# Altium schematic symbol library AliPadash.SchLib: 1186 symbols (part 3 of 6) (continued)
## Heat-sink (continued)
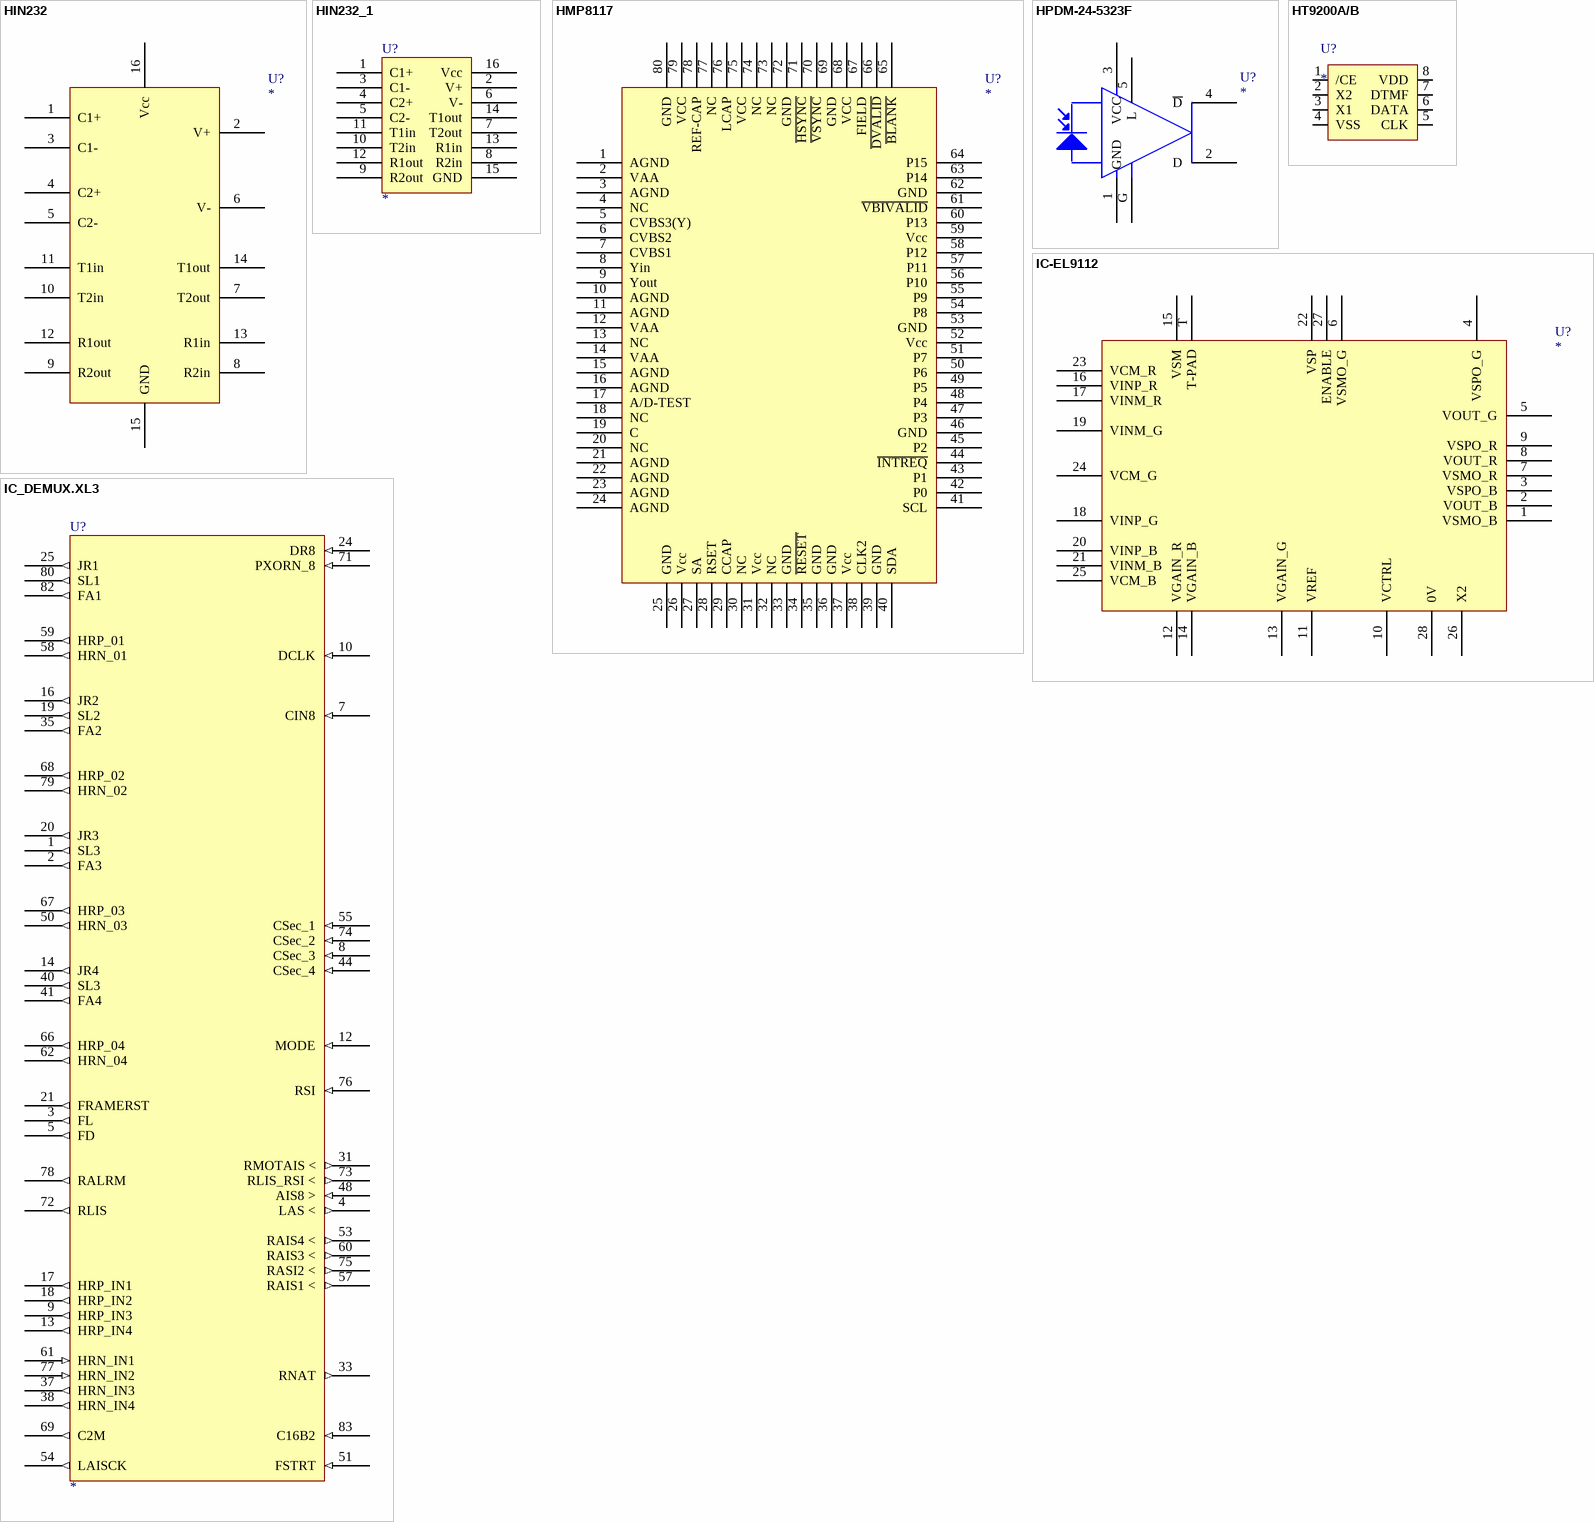
[diagram p31: symbols HIN232 to IC_DEMUX.XL3]

## HIN232
designator U?
footprint DIP16
pins: 1 C1+, 2 V+, 3 C1-, 4 C2+, 5 C2-, 6 V-, 7 T2out, 8 R2in, 9 R2out, 10 T2in, 11 T1in, 12 R1out, 13 R1in, 14 T1out, 15 GND, 16 Vcc

## HIN232_1
designator U?
footprint DIP16
pins: 1 C1+, 2 V+, 3 C1-, 4 C2+, 5 C2-, 6 V-, 7 T2out, 8 R2in, 9 R2out, 10 T2in, 11 T1in, 12 R1out, 13 R1in, 14 T1out, 15 GND, 16 Vcc

## HMP8117
designator U?
footprint MQFP80
pins: 1 AGND, 2 VAA, 3 AGND, 4 NC, 5 CVBS3(Y), 6 CVBS2, 7 CVBS1, 8 Yin, 9 Yout, 10 AGND, 11 AGND, 12 VAA, 13 NC, 14 VAA, 15 AGND, 16 AGND, 17 A/D-TEST, 18 NC, 19 C, 20 NC, 21 AGND, 22 AGND, 23 AGND, 24 AGND, 25 GND, 26 Vcc, 27 SA, 28 RSET, 29 CCAP, 30 NC, 31 Vcc, 32 NC, 33 GND, 34 ~{RESET}, 35 GND, 36 GND, 37 Vcc, 38 CLK2, 39 GND, 40 SDA, 41 SCL, 42 P0, 43 P1, 44 ~{INTREQ}, 45 P2, 46 GND, 47 P3, 48 P4, 49 P5, 50 P6, 51 P7, 52 Vcc, 53 GND, 54 P8, 55 P9, 56 P10, 57 P11, 58 P12, 59 Vcc, 60 P13, 61 ~{VBIVALID}, 62 GND, 63 P14, 64 P15, 65 ~{BLANK}, 66 ~{DVALID}, 67 FIELD, 68 VCC, 69 GND, 70 ~{VSYNC}, 71 ~{HSYNC}, 72 GND, 73 NC, 74 NC, 75 VCC, 76 LCAP, 77 NC, 78 REF-CAP, 79 VCC, 80 GND

## HPDM-24-5323F
designator U?
footprint LDHP3
pins: 1 GND, 2 D, 3 VCC, 4 ~{D}, 5 L, G

## HT9200A/B
designator U?
footprint DIP8-SMD
pins: 1 /CE, 2 X2, 3 X1, 4 VSS, 5 CLK, 6 DATA, 7 DTMF, 8 VDD

## IC-EL9112
designator U?
footprint QFN28
pins: 1 VSMO_B, 2 VOUT_B, 3 VSPO_B, 4 VSPO_G, 5 VOUT_G, 6 VSMO_G, 7 VSMO_R, 8 VOUT_R, 9 VSPO_R, 10 VCTRL, 11 VREF, 12 VGAIN_R, 13 VGAIN_G, 14 VGAIN_B, 15 VSM, 16 VINP_R, 17 VINM_R, 18 VINP_G, 19 VINM_G, 20 VINP_B, 21 VINM_B, 22 VSP, 23 VCM_R, 24 VCM_G, 25 VCM_B, 26 X2, 27 ENABLE, 28 0V, T T-PAD

## IC_DEMUX.XL3
designator U?
pins: 1 SL3 (out), 2 FA3 (out), 3 FL (out), 4 LAS < (out), 5 FD (out), 6 GND (power) hidden to GND, 7 CIN8 (in), 8 CSec_3 (in), 9 HRP_IN3 (out), 10 DCLK (in), 12 MODE (in), 13 HRP_IN4 (out), 14 JR4 (out), 16 JR2 (out), 17 HRP_IN1 (out), 18 HRP_IN2 (out), 19 SL2 (out), 20 JR3 (out), 21 FRAMERST (out), 22 VCC (power) hidden to VCC, 24 DR8 (in), 25 JR1 (out), 28 GND (power) hidden to GND, 31 RMOTAIS < (out), 33 RNAT (out), 35 FA2 (out), 37 HRN_IN3 (out), 38 HRN_IN4 (out), 40 SL3 (out), 41 FA4 (out), 43 VCC (power) hidden to VCC, 44 CSec_4 (in), 48 AIS8 > (in), 49 GND (power) hidden to GND, 50 HRN_03 (out), 51 FSTRT (in), 53 RAIS4 < (out), 54 LAISCK (out), 55 CSec_1 (in), 57 RAIS1 < (out), 58 HRN_01 (out), 59 HRP_01 (out), 60 RAIS3 < (out), 61 HRN_IN1 (in), 62 HRN_04 (out), 65 VCC (power) hidden to VCC, 66 HRP_04 (out), 67 HRP_03 (out), 68 HRP_02 (out), 69 C2M (out), 70 GND (power) hidden to GND, 71 PXORN_8 (in), 72 RLIS (out), 73 RLIS_RSI < (out), 74 CSec_2 (in), 75 RASI2 < (out), 76 RSI (in), 77 HRN_IN2 (in), 78 RALRM (out), 79 HRN_02 (out), 80 SL1 (out), 82 FA1 (out), 83 C16B2 (in), 84 VCC (power) hidden to VCC

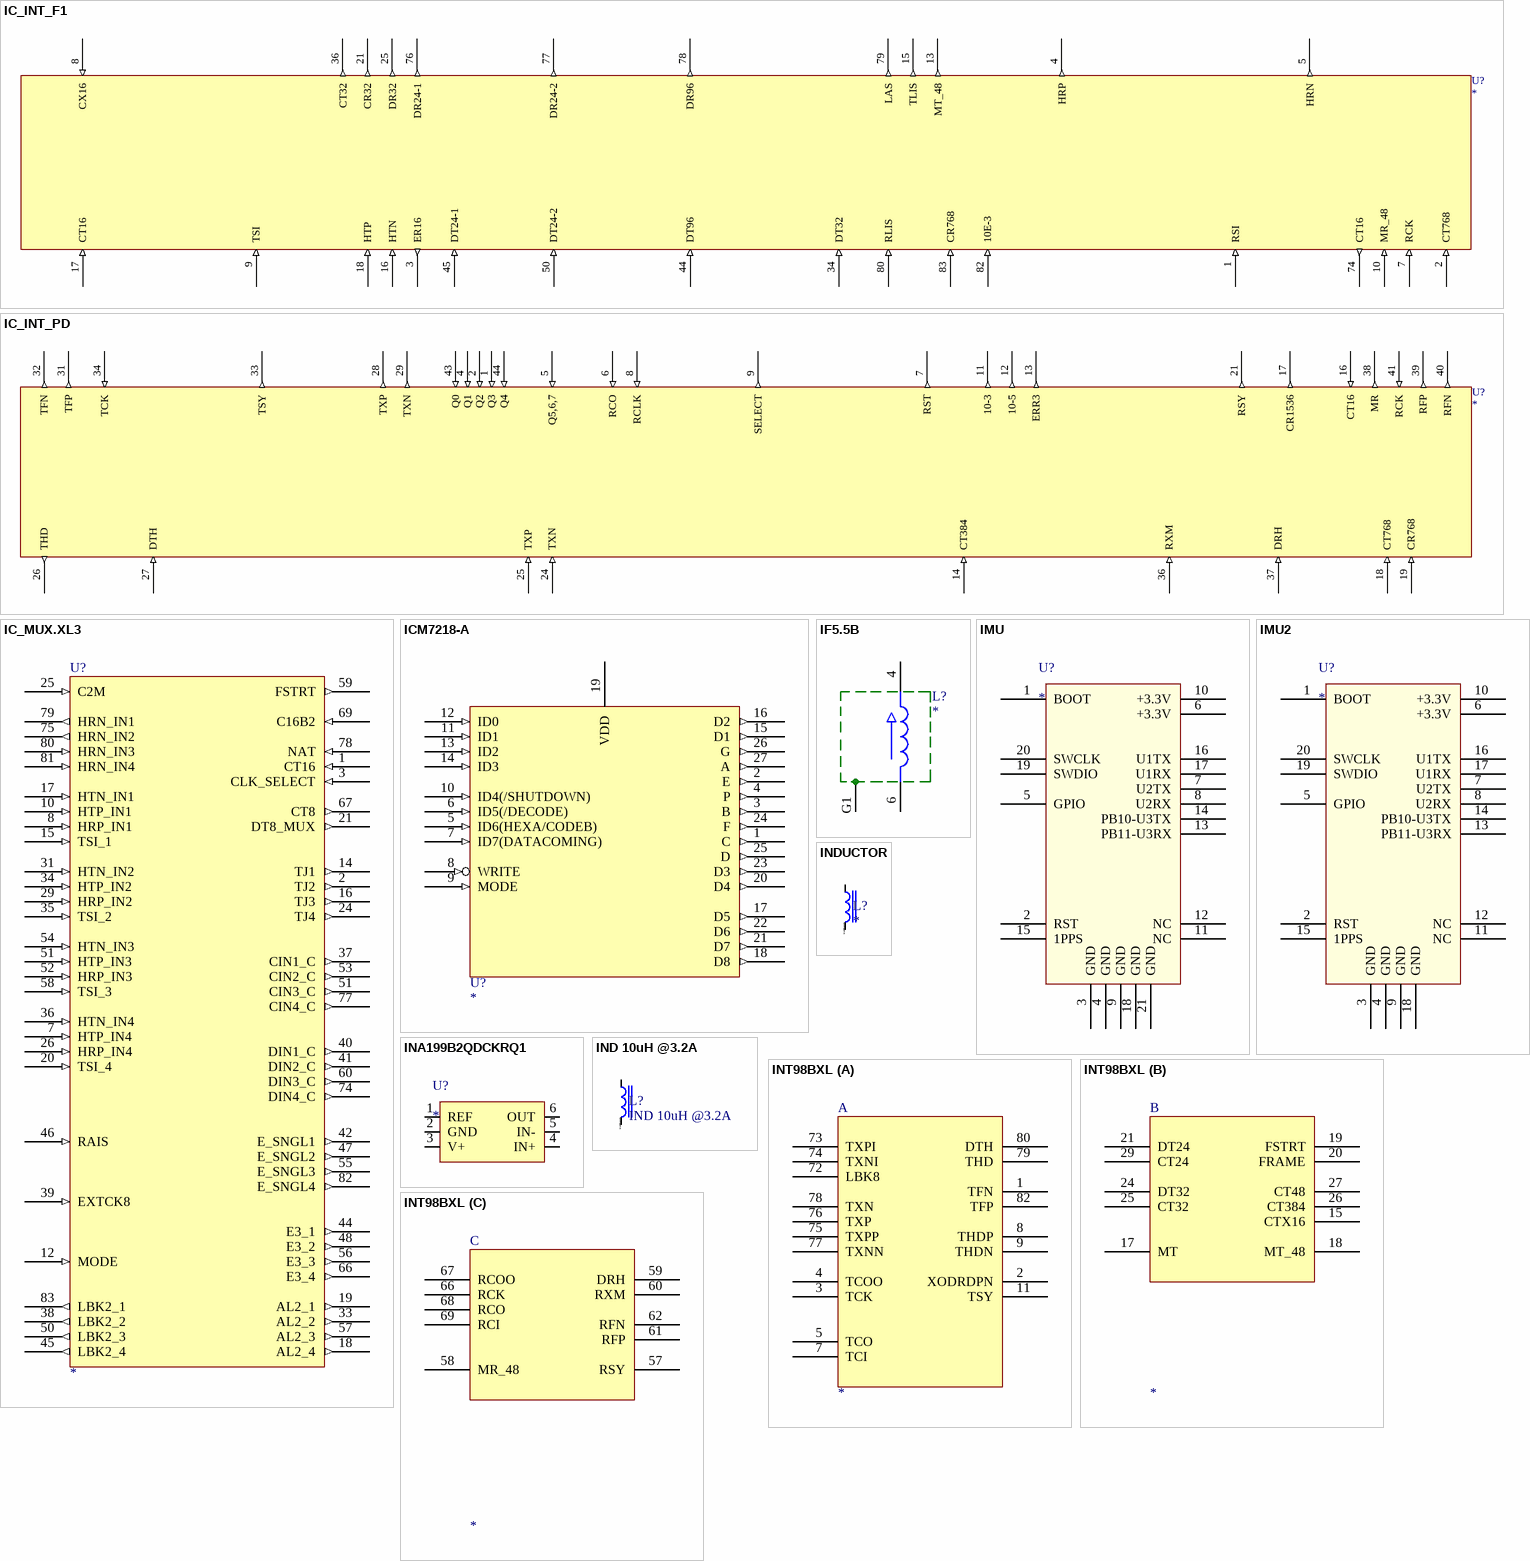
[diagram p32: symbols IC_INT_F1 to INT98BXL]

## IC_INT_F1
designator U?
pins: 1 RSI (in), 2 CT768 (in), 3 ER16 (out), 4 HRP (out), 5 HRN (out), 7 RCK (in), 8 CX16 (in), 9 TSI (in), 10 MR_48 (in), 13 MT_48 (out), 15 TLIS (out), 16 HTN (in), 17 CT16 (in), 18 HTP (in), 21 CR32 (out), 25 DR32 (out), 34 DT32 (in), 36 CT32 (out), 44 DT96 (in), 45 DT24-1 (in), 50 DT24-2 (in), 74 CT16 (out), 76 DR24-1 (out), 77 DR24-2 (out), 78 DR96 (out), 79 LAS (out), 80 RLIS (in), 82 10E-3 (in), 83 CR768 (in)

## IC_INT_PD
designator U?
pins: 1 Q3 (in), 2 Q2 (in), 4 Q1 (in), 5 Q5,6,7 (in), 6 RCO (in), 7 RST (out), 8 RCLK (in), 9 SELECT (out), 11 10-3 (out), 12 10-5 (out), 13 ERR3 (out), 14 CT384 (in), 16 CT16 (in), 17 CR1536 (out), 18 CT768 (in), 19 CR768 (in), 21 RSY (out), 24 TXN (in), 25 TXP (in), 26 THD (out), 27 DTH (in), 28 TXP (out), 29 TXN (out), 31 TFP (out), 32 TFN (out), 33 TSY (out), 34 TCK (in), 36 RXM (in), 37 DRH (in), 38 MR (out), 39 RFP (out), 40 RFN (out), 41 RCK (in), 43 Q0 (in), 44 Q4 (in)

## IC_MUX.XL3
designator U?
pins: 1 CT16 (in), 2 TJ2 (out), 3 CLK_SELECT (in), 6 GND (power) hidden to GND, 7 HTP_IN4 (in), 8 HRP_IN1 (in), 10 HTP_IN1 (in), 12 MODE (in), 14 TJ1 (out), 15 TSI_1 (in), 16 TJ3 (out), 17 HTN_IN1 (in), 18 AL2_4 (out), 19 AL2_1 (out), 20 TSI_4 (in), 21 DT8_MUX (out), 22 VCC (power) hidden to VCC, 24 TJ4 (out), 25 C2M (in), 26 HRP_IN4 (in), 28 GND (power) hidden to GND, 29 HRP_IN2 (in), 31 HTN_IN2 (in), 33 AL2_2 (out), 34 HTP_IN2 (in), 35 TSI_2 (in), 36 HTN_IN4 (in), 37 CIN1_C (out), 38 LBK2_2 (out), 39 EXTCK8 (in), 40 DIN1_C (out), 41 DIN2_C (out), 42 E_SNGL1 (out), 43 VCC (power) hidden to VCC, 44 E3_1 (out), 45 LBK2_4 (out), 46 RAIS (in), 47 E_SNGL2 (out), 48 E3_2 (out), 49 GND (power) hidden to GND, 50 LBK2_3 (out), 51 HTP_IN3 (in), 51 CIN3_C (out), 52 HRP_IN3 (in), 53 CIN2_C (out), 54 HTN_IN3 (in), 55 E_SNGL3 (out), 56 E3_3 (out), 57 AL2_3 (out), 58 TSI_3 (in), 59 FSTRT (out), 60 DIN3_C (out), 65 VCC (power) hidden to VCC, 66 E3_4 (out), 67 CT8 (out), 69 C16B2 (in), 70 GND (power) hidden to GND, 74 DIN4_C (out), 75 HRN_IN2 (out), 77 CIN4_C (out), 78 NAT (in), 79 HRN_IN1 (out), 80 HRN_IN3 (in), 81 HRN_IN4 (in), 82 E_SNGL4 (out), 83 LBK2_1 (out), 84 VCC (power) hidden to VCC

## ICM7218-A
designator U?
pins: 1 C (out), 2 E (out), 3 B (out), 4 P (out), 5 ID6(HEXA/CODEB) (in), 6 ID5(/DECODE) (in), 7 ID7(DATACOMING) (in), 8 WRITE (in), 9 MODE (in), 10 ID4(/SHUTDOWN) (in), 11 ID1 (in), 12 ID0 (in), 13 ID2 (in), 14 ID3 (in), 15 D1 (out), 16 D2 (out), 17 D5 (out), 18 D8 (out), 19 VDD, 20 D4 (out), 21 D7 (out), 22 D6 (out), 23 D3 (out), 24 F (out), 25 D (out), 26 G (out), 27 A (out), 28 VSS (power) hidden to VSS

## IF5.5B
designator L?
pins: 4, 6, G1 GND

## IMU
designator U?
pins: 1 BOOT, 2 RST, 3 GND, 4 GND, 5 GPIO, 6 +3.3V, 7 U2TX, 8 U2RX, 9 GND, 10 +3.3V, 11 NC, 12 NC, 13 PB11-U3RX, 14 PB10-U3TX, 15 1PPS, 16 U1TX, 17 U1RX, 18 GND, 19 SWDIO, 20 SWCLK, 21 GND

## IMU2
designator U?
pins: 1 BOOT, 2 RST, 3 GND, 4 GND, 5 GPIO, 6 +3.3V, 7 U2TX, 8 U2RX, 9 GND, 10 +3.3V, 11 NC, 12 NC, 13 PB11-U3RX, 14 PB10-U3TX, 15 1PPS, 16 U1TX, 17 U1RX, 18 GND, 19 SWDIO, 20 SWCLK

## INA199B2QDCKRQ1
designator U?
footprint SOT363
pins: 1 REF, 2 GND, 3 V+, 4 IN+, 5 IN-, 6 OUT

## IND 10uH @3.2A
designator L?
MFAC: FXL0530-100-M; JLC: C177248
footprint inducsmd7mm
pins: 1, 2
text: @DesignPCB

## INDUCTOR
designator L?
JLC: *; MFAC: *
pins: 1, 2
text: @DesignPCB

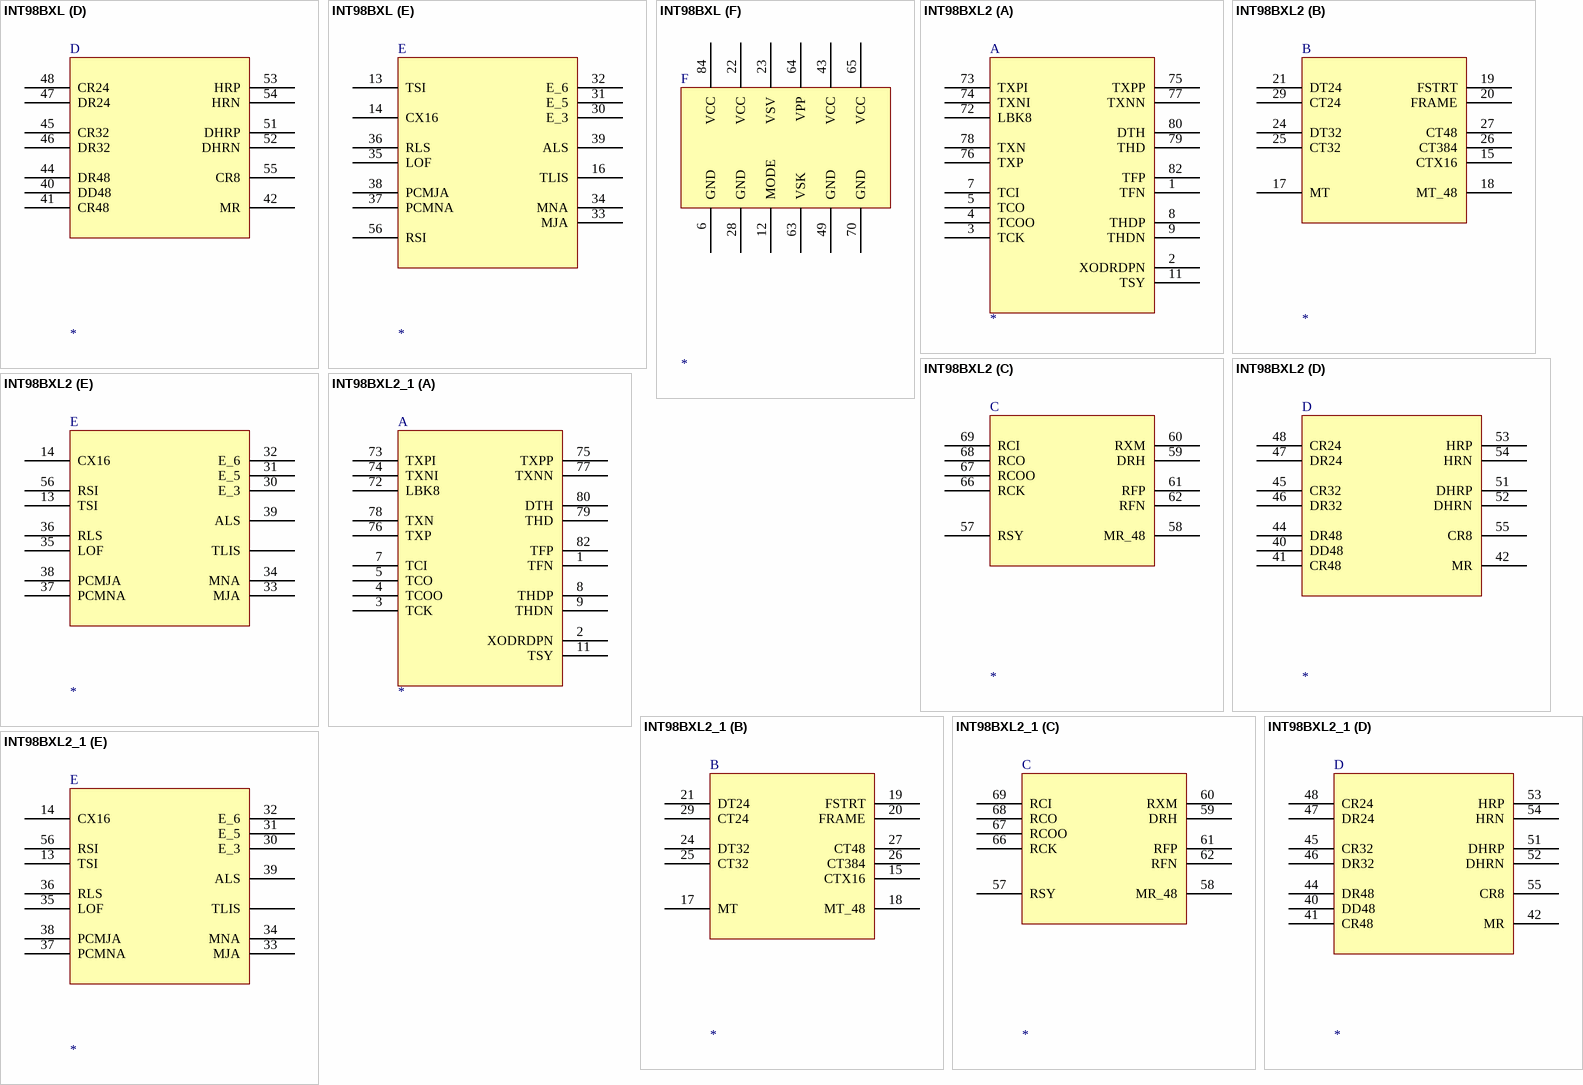
[diagram p33: symbols INT98BXL to INT98BXL2_1]

## INT98BXL
designator ?
part A pins: 1 TFN, 2 XODRDPN, 3 TCK, 4 TCOO, 5 TCO, 7 TCI, 8 THDP, 9 THDN, 11 TSY, 72 LBK8, 73 TXPI, 74 TXNI, 75 TXPP, 76 TXP, 77 TXNN, 78 TXN, 79 THD, 80 DTH, 82 TFP
part B pins: 15 CTX16, 17 MT, 18 MT_48, 19 FSTRT, 20 FRAME, 21 DT24, 24 DT32, 25 CT32, 26 CT384, 27 CT48, 29 CT24
part C pins: 57 RSY, 58 MR_48, 59 DRH, 60 RXM, 61 RFP, 62 RFN, 66 RCK, 67 RCOO, 68 RCO, 69 RCI
part D pins: 40 DD48, 41 CR48, 42 MR, 44 DR48, 45 CR32, 46 DR32, 47 DR24, 48 CR24, 51 DHRP, 52 DHRN, 53 HRP, 54 HRN, 55 CR8
part E pins: 13 TSI, 14 CX16, 16 TLIS, 30 E_3, 31 E_5, 32 E_6, 33 MJA, 34 MNA, 35 LOF, 36 RLS, 37 PCMNA, 38 PCMJA, 39 ALS, 56 RSI
part F pins: 6 GND, 12 MODE, 22 VCC, 23 VSV, 28 GND, 43 VCC, 49 GND, 63 VSK, 64 VPP, 65 VCC, 70 GND, 84 VCC

## INT98BXL2
designator ?
part A pins: 1 TFN, 2 XODRDPN, 3 TCK, 4 TCOO, 5 TCO, 7 TCI, 8 THDP, 9 THDN, 11 TSY, 72 LBK8, 73 TXPI, 74 TXNI, 75 TXPP, 76 TXP, 77 TXNN, 78 TXN, 79 THD, 80 DTH, 82 TFP
part B pins: 15 CTX16, 17 MT, 18 MT_48, 19 FSTRT, 20 FRAME, 21 DT24, 24 DT32, 25 CT32, 26 CT384, 27 CT48, 29 CT24
part C pins: 57 RSY, 58 MR_48, 59 DRH, 60 RXM, 61 RFP, 62 RFN, 66 RCK, 67 RCOO, 68 RCO, 69 RCI
part D pins: 40 DD48, 41 CR48, 42 MR, 44 DR48, 45 CR32, 46 DR32, 47 DR24, 48 CR24, 51 DHRP, 52 DHRN, 53 HRP, 54 HRN, 55 CR8
part E pins: 13 TSI, 14 CX16, 30 E_3, 31 E_5, 32 E_6, 33 MJA, 34 MNA, 35 LOF, 36 RLS, 37 PCMNA, 38 PCMJA, 39 ALS, 56 RSI, ? TLIS

## INT98BXL2_1
designator ?
part A pins: 1 TFN, 2 XODRDPN, 3 TCK, 4 TCOO, 5 TCO, 7 TCI, 8 THDP, 9 THDN, 11 TSY, 72 LBK8, 73 TXPI, 74 TXNI, 75 TXPP, 76 TXP, 77 TXNN, 78 TXN, 79 THD, 80 DTH, 82 TFP
part B pins: 15 CTX16, 17 MT, 18 MT_48, 19 FSTRT, 20 FRAME, 21 DT24, 24 DT32, 25 CT32, 26 CT384, 27 CT48, 29 CT24
part C pins: 57 RSY, 58 MR_48, 59 DRH, 60 RXM, 61 RFP, 62 RFN, 66 RCK, 67 RCOO, 68 RCO, 69 RCI
part D pins: 40 DD48, 41 CR48, 42 MR, 44 DR48, 45 CR32, 46 DR32, 47 DR24, 48 CR24, 51 DHRP, 52 DHRN, 53 HRP, 54 HRN, 55 CR8
part E pins: 13 TSI, 14 CX16, 30 E_3, 31 E_5, 32 E_6, 33 MJA, 34 MNA, 35 LOF, 36 RLS, 37 PCMNA, 38 PCMJA, 39 ALS, 56 RSI, ? TLIS

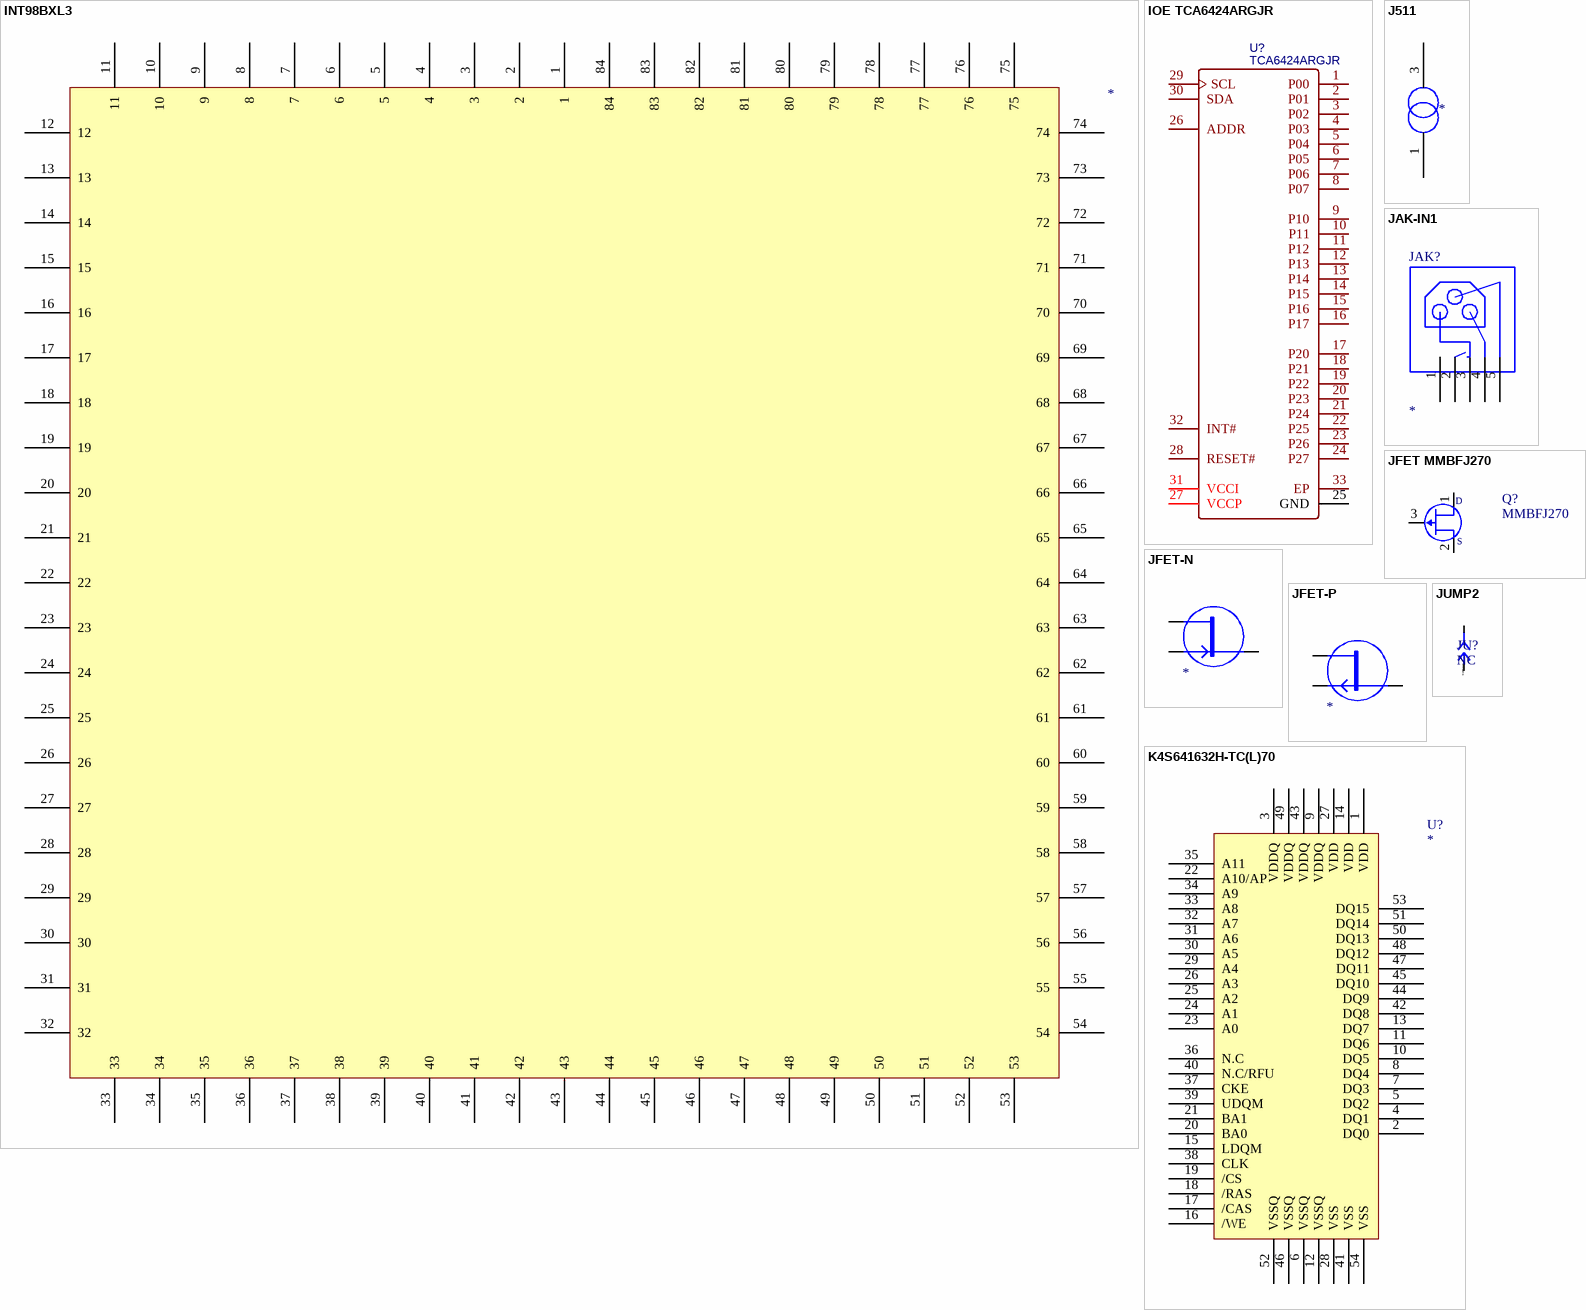
[diagram p34: symbols INT98BXL3 to K4S641632H-TC(L)70]

## INT98BXL3
designator ?
pins: 1, 2, 3, 4, 5, 6, 7, 8, 9, 10, 11, 12, 13, 14, 15, 16, 17, 18, 19, 20, 21, 22, 23, 24, 25, 26, 27, 28, 29, 30, 31, 32, 33, 34, 35, 36, 37, 38, 39, 40, 41, 42, 43, 44, 45, 46, 47, 48, 49, 50, 51, 52, 53, 54, 55, 56, 57, 58, 59, 60, 61, 62, 63, 64, 65, 66, 67, 68, 69, 70, 71, 72, 73, 74, 75, 76, 77, 78, 79, 80, 81, 82, 83, 84

## IOE TCA6424ARGJR
designator U?, comment TCA6424ARGJR
Manufacturer: TI(德州仪器); Supplier: LCSC; Manufacturer Part: TCA6424ARGJR; Supplier Part: C80692; JLCPCB Part Class: Extended Part; spicePre: U; spiceSymbolName: TCA6424ARGJR; JLC: C80692; MAFC: TCA6424ARGJR
footprint VQFN-32_L5.0-W5.0-P0.50-TL-EP (Footprint not found)
pins: 1 P00, 2 P01, 3 P02, 4 P03, 5 P04, 6 P05, 7 P06, 8 P07, 9 P10, 10 P11, 11 P12, 12 P13, 13 P14, 14 P15, 15 P16, 16 P17, 17 P20, 18 P21, 19 P22, 20 P23, 21 P24, 22 P25, 23 P26, 24 P27, 25 GND, 26 ADDR, 27 VCCP, 28 RESET#, 29 SCL, 30 SDA, 31 VCCI, 32 INT#, 33 EP

## J511
designator ?
pins: 1, 3

## JAK-IN1
designator JAK?
footprint JAK-PWR1
pins: 1, 2, 3, 4, 5

## JFET MMBFJ270
designator Q?, comment MMBFJ270
JLC: C160435; MFAC: MMBFJ270
footprint SOT-23
pins: 1, 2, 3
text: D; S

## JFET-N
designator ?
pins: 1, 2, 3

## JFET-P
designator ?
pins: 1, 2, 3

## JUMP2
designator JU?, comment NC  (net tie, no BOM)
footprint JUMP4
footprint JUMP2
pins: 1, 2
text: @DesignPCB

## K4S641632H-TC(L)70
designator U?
footprint TSOP54
pins: 1 VDD, 2 DQ0, 3 VDDQ, 4 DQ1, 5 DQ2, 6 VSSQ, 7 DQ3, 8 DQ4, 9 VDDQ, 10 DQ5, 11 DQ6, 12 VSSQ, 13 DQ7, 14 VDD, 15 LDQM, 16 /WE, 17 /CAS, 18 /RAS, 19 /CS, 20 BA0, 21 BA1, 22 A10/AP, 23 A0, 24 A1, 25 A2, 26 A3, 27 VDD, 28 VSS, 29 A4, 30 A5, 31 A6, 32 A7, 33 A8, 34 A9, 35 A11, 36 N.C, 37 CKE, 38 CLK, 39 UDQM, 40 N.C/RFU, 41 VSS, 42 DQ8, 43 VDDQ, 44 DQ9, 45 DQ10, 46 VSSQ, 47 DQ11, 48 DQ12, 49 VDDQ, 50 DQ13, 51 DQ14, 52 VSSQ, 53 DQ15, 54 VSS

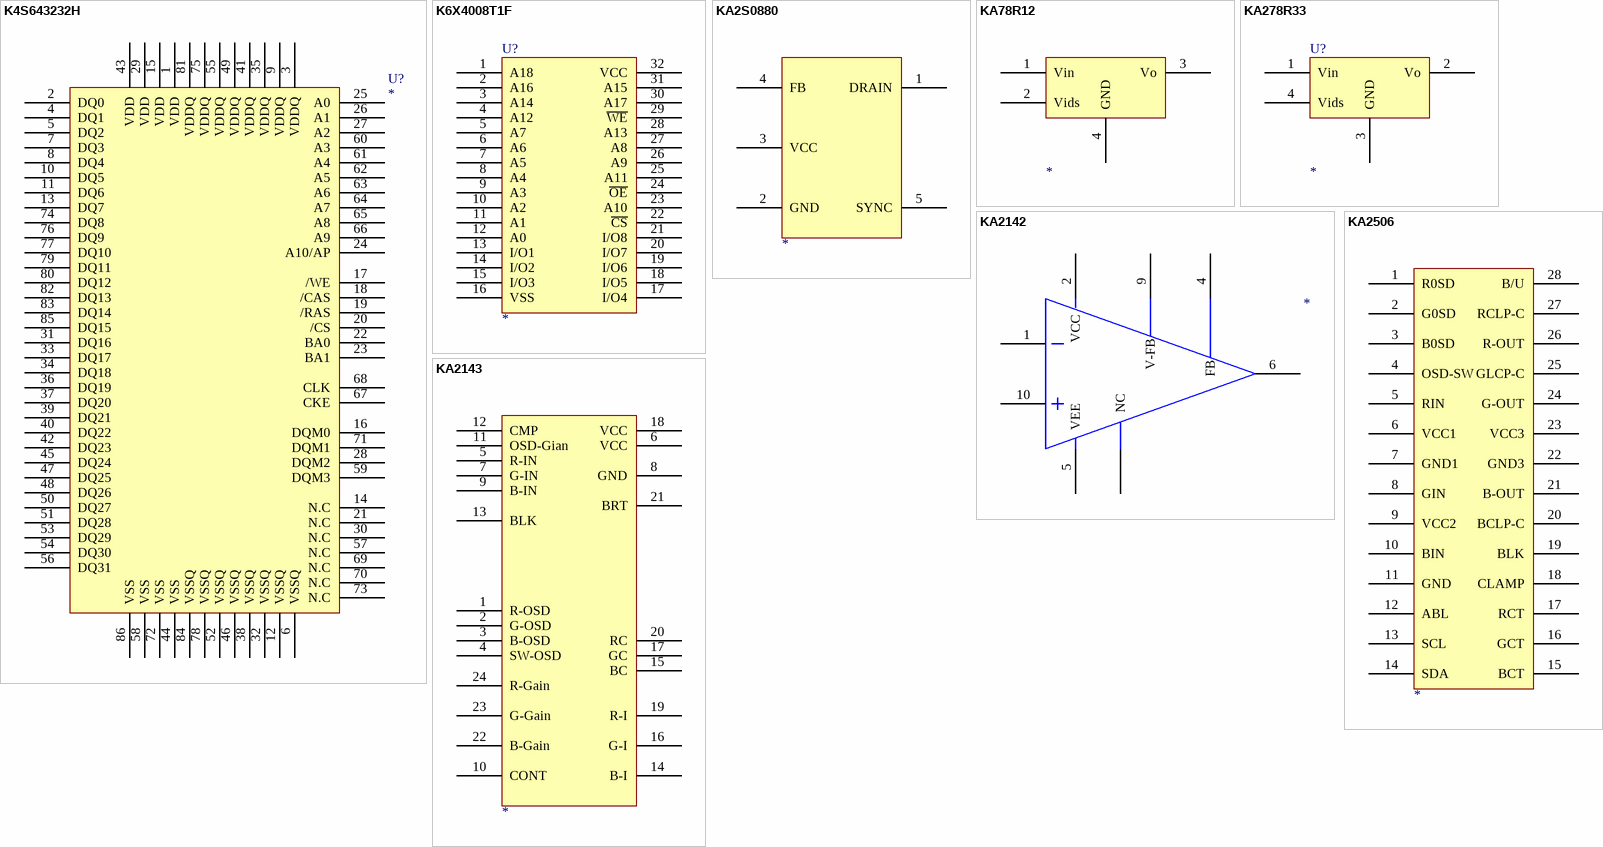
[diagram p35: symbols K4S643232H to KA2506]

## K4S643232H
designator U?
footprint TSOP86
pins: 1 VDD, 2 DQ0, 3 VDDQ, 4 DQ1, 5 DQ2, 6 VSSQ, 7 DQ3, 8 DQ4, 9 VDDQ, 10 DQ5, 11 DQ6, 12 VSSQ, 13 DQ7, 14 N.C, 15 VDD, 16 DQM0, 17 /WE, 18 /CAS, 19 /RAS, 20 /CS, 21 N.C, 22 BA0, 23 BA1, 24 A10/AP, 25 A0, 26 A1, 27 A2, 28 DQM2, 29 VDD, 30 N.C, 31 DQ16, 32 VSSQ, 33 DQ17, 34 DQ18, 35 VDDQ, 36 DQ19, 37 DQ20, 38 VSSQ, 39 DQ21, 40 DQ22, 41 VDDQ, 42 DQ23, 43 VDD, 44 VSS, 45 DQ24, 46 VSSQ, 47 DQ25, 48 DQ26, 49 VDDQ, 50 DQ27, 51 DQ28, 52 VSSQ, 53 DQ29, 54 DQ30, 55 VDDQ, 56 DQ31, 57 N.C, 58 VSS, 59 DQM3, 60 A3, 61 A4, 62 A5, 63 A6, 64 A7, 65 A8, 66 A9, 67 CKE, 68 CLK, 69 N.C, 70 N.C, 71 DQM1, 72 VSS, 73 N.C, 74 DQ8, 75 VDDQ, 76 DQ9, 77 DQ10, 78 VSSQ, 79 DQ11, 80 DQ12, 81 VDDQ, 82 DQ13, 83 DQ14, 84 VSSQ, 85 DQ15, 86 VSS

## K6X4008T1F
designator U?
footprint SOP32
pins: 1 A18, 2 A16, 3 A14, 4 A12, 5 A7, 6 A6, 7 A5, 8 A4, 9 A3, 10 A2, 11 A1, 12 A0, 13 I/O1, 14 I/O2, 15 I/O3, 16 VSS, 17 I/O4, 18 I/O5, 19 I/O6, 20 I/O7, 21 I/O8, 22 ~{CS}, 23 A10, 24 ~{OE}, 25 A11, 26 A9, 27 A8, 28 A13, 29 ~{WE}, 30 A17, 31 A15, 32 VCC

## KA2S0880
designator ?
pins: 1 DRAIN, 2 GND, 3 VCC, 4 FB, 5 SYNC

## KA78R12
designator ?
pins: 1 Vin, 2 Vids, 3 Vo, 4 GND

## KA278R33
designator U?
footprint TO-220F-4L
footprint TO-220F-4LB
footprint TO-220F-4LH
pins: 1 Vin, 2 Vo, 3 GND, 4 Vids

## KA2142
designator ?
pins: 1, 2  VCC  , 3         NC       , 4                FB               , 5    VEE  , 6, 9         V-FB         , 10

## KA2143
designator ?
pins: 1 R-OSD, 2 G-OSD, 3 B-OSD, 4 SW-OSD, 5 R-IN, 6 VCC, 7 G-IN, 8 GND, 9 B-IN, 10 CONT, 11 OSD-Gian, 12 CMP, 13 BLK, 14 B-I, 15 BC, 16 G-I, 17 GC, 18 VCC, 19 R-I, 20 RC, 21 BRT, 22 B-Gain, 23 G-Gain, 24 R-Gain

## KA2506
designator ?
pins: 1 R0SD, 2 G0SD, 3 B0SD, 4 OSD-SW, 5 RIN, 6 VCC1, 7 GND1, 8 GIN, 9 VCC2, 10 BIN, 11 GND, 12 ABL, 13 SCL, 14 SDA, 15 BCT, 16 GCT, 17 RCT, 18 CLAMP, 19 BLK, 20 BCLP-C, 21 B-OUT, 22 GND3, 23 VCC3, 24 G-OUT, 25 GLCP-C, 26 R-OUT, 27 RCLP-C, 28 B/U

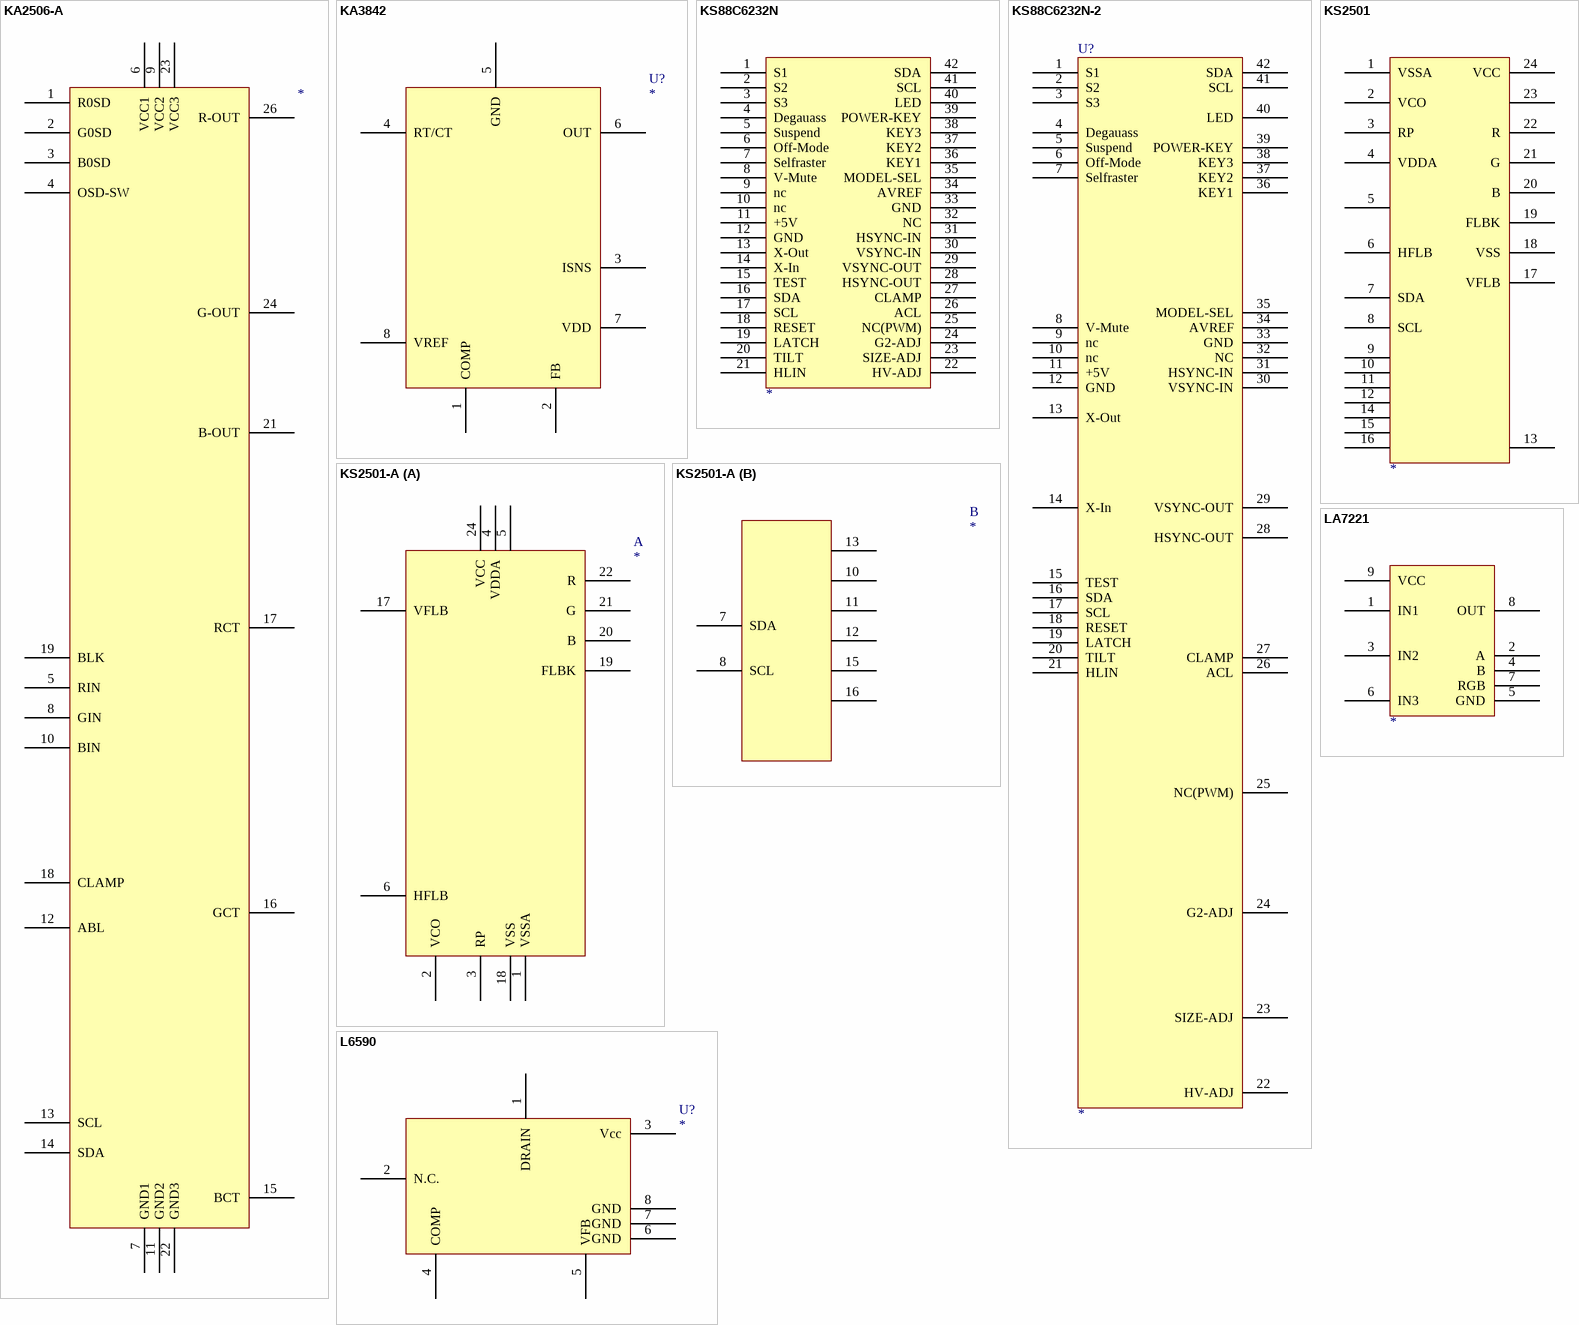
[diagram p36: symbols KA2506-A to LA7221]

## KA2506-A
designator ?
pins: 1 R0SD, 2 G0SD, 3 B0SD, 4 OSD-SW, 5 RIN, 6 VCC1, 7 GND1, 8 GIN, 9 VCC2, 10 BIN, 11 GND2, 12 ABL, 13 SCL, 14 SDA, 15 BCT, 16 GCT, 17 RCT, 18 CLAMP, 19 BLK, 21 B-OUT, 22 GND3, 23 VCC3, 24 G-OUT, 26 R-OUT

## KA3842
designator U?
footprint DIP8
pins: 1 COMP, 2 FB, 3 ISNS, 4 RT/CT, 5 GND, 6 OUT, 7 VDD, 8 VREF

## KS88C6232N
designator ?
pins: 1 S1, 2 S2, 3 S3, 4 Degauass, 5 Suspend, 6 Off-Mode, 7 Selfraster, 8 V-Mute, 9 nc, 10 nc, 11 +5V, 12 GND, 13 X-Out, 14 X-In, 15 TEST, 16 SDA, 17 SCL, 18 RESET, 19 LATCH, 20 TILT, 21 HLIN, 22 HV-ADJ, 23 SIZE-ADJ, 24 G2-ADJ, 25 NC(PWM), 26 ACL, 27 CLAMP, 28 HSYNC-OUT, 29 VSYNC-OUT, 30 VSYNC-IN, 31 HSYNC-IN, 32 NC, 33 GND, 34 AVREF, 35 MODEL-SEL, 36 KEY1, 37 KEY2, 38 KEY3, 39 POWER-KEY, 40 LED, 41 SCL, 42 SDA

## KS88C6232N-2
designator U?
pins: 1 S1, 2 S2, 3 S3, 4 Degauass, 5 Suspend, 6 Off-Mode, 7 Selfraster, 8 V-Mute, 9 nc, 10 nc, 11 +5V, 12 GND, 13 X-Out, 14 X-In, 15 TEST, 16 SDA, 17 SCL, 18 RESET, 19 LATCH, 20 TILT, 21 HLIN, 22 HV-ADJ, 23 SIZE-ADJ, 24 G2-ADJ, 25 NC(PWM), 26 ACL, 27 CLAMP, 28 HSYNC-OUT, 29 VSYNC-OUT, 30 VSYNC-IN, 31 HSYNC-IN, 32 NC, 33 GND, 34 AVREF, 35 MODEL-SEL, 36 KEY1, 37 KEY2, 38 KEY3, 39 POWER-KEY, 40 LED, 41 SCL, 42 SDA

## KS2501
designator ?
pins: 1 VSSA, 2 VCO, 3 RP, 4 VDDA, 5, 6 HFLB, 7 SDA, 8 SCL, 9, 10, 11, 12, 13, 14, 15, 16, 17 VFLB, 18 VSS, 19 FLBK, 20 B, 21 G, 22 R, 23, 24 VCC

## KS2501-A
designator ?
part A pins: 1 VSSA, 2 VCO, 3 RP, 4 VDDA, 5, 6 HFLB, 17 VFLB, 18 VSS, 19 FLBK, 20 B, 21 G, 22 R, 24 VCC
part B pins: 7 SDA, 8 SCL, 10, 11, 12, 13, 15, 16

## L6590
designator U?
footprint DIP8
pins: 1 DRAIN, 2 N.C., 3 Vcc, 4 COMP, 5 VFB, 6 GND, 7 GND, 8 GND

## LA7221
designator ?
U?
pins: 1 IN1, 2 A, 3 IN2, 4 B, 5 GND (power), 6 IN3, 7 RGB, 8 OUT, 9 VCC (power)
